# Altium integrated library GPDSE.IntLib: 634 symbols (part 2 of 7)
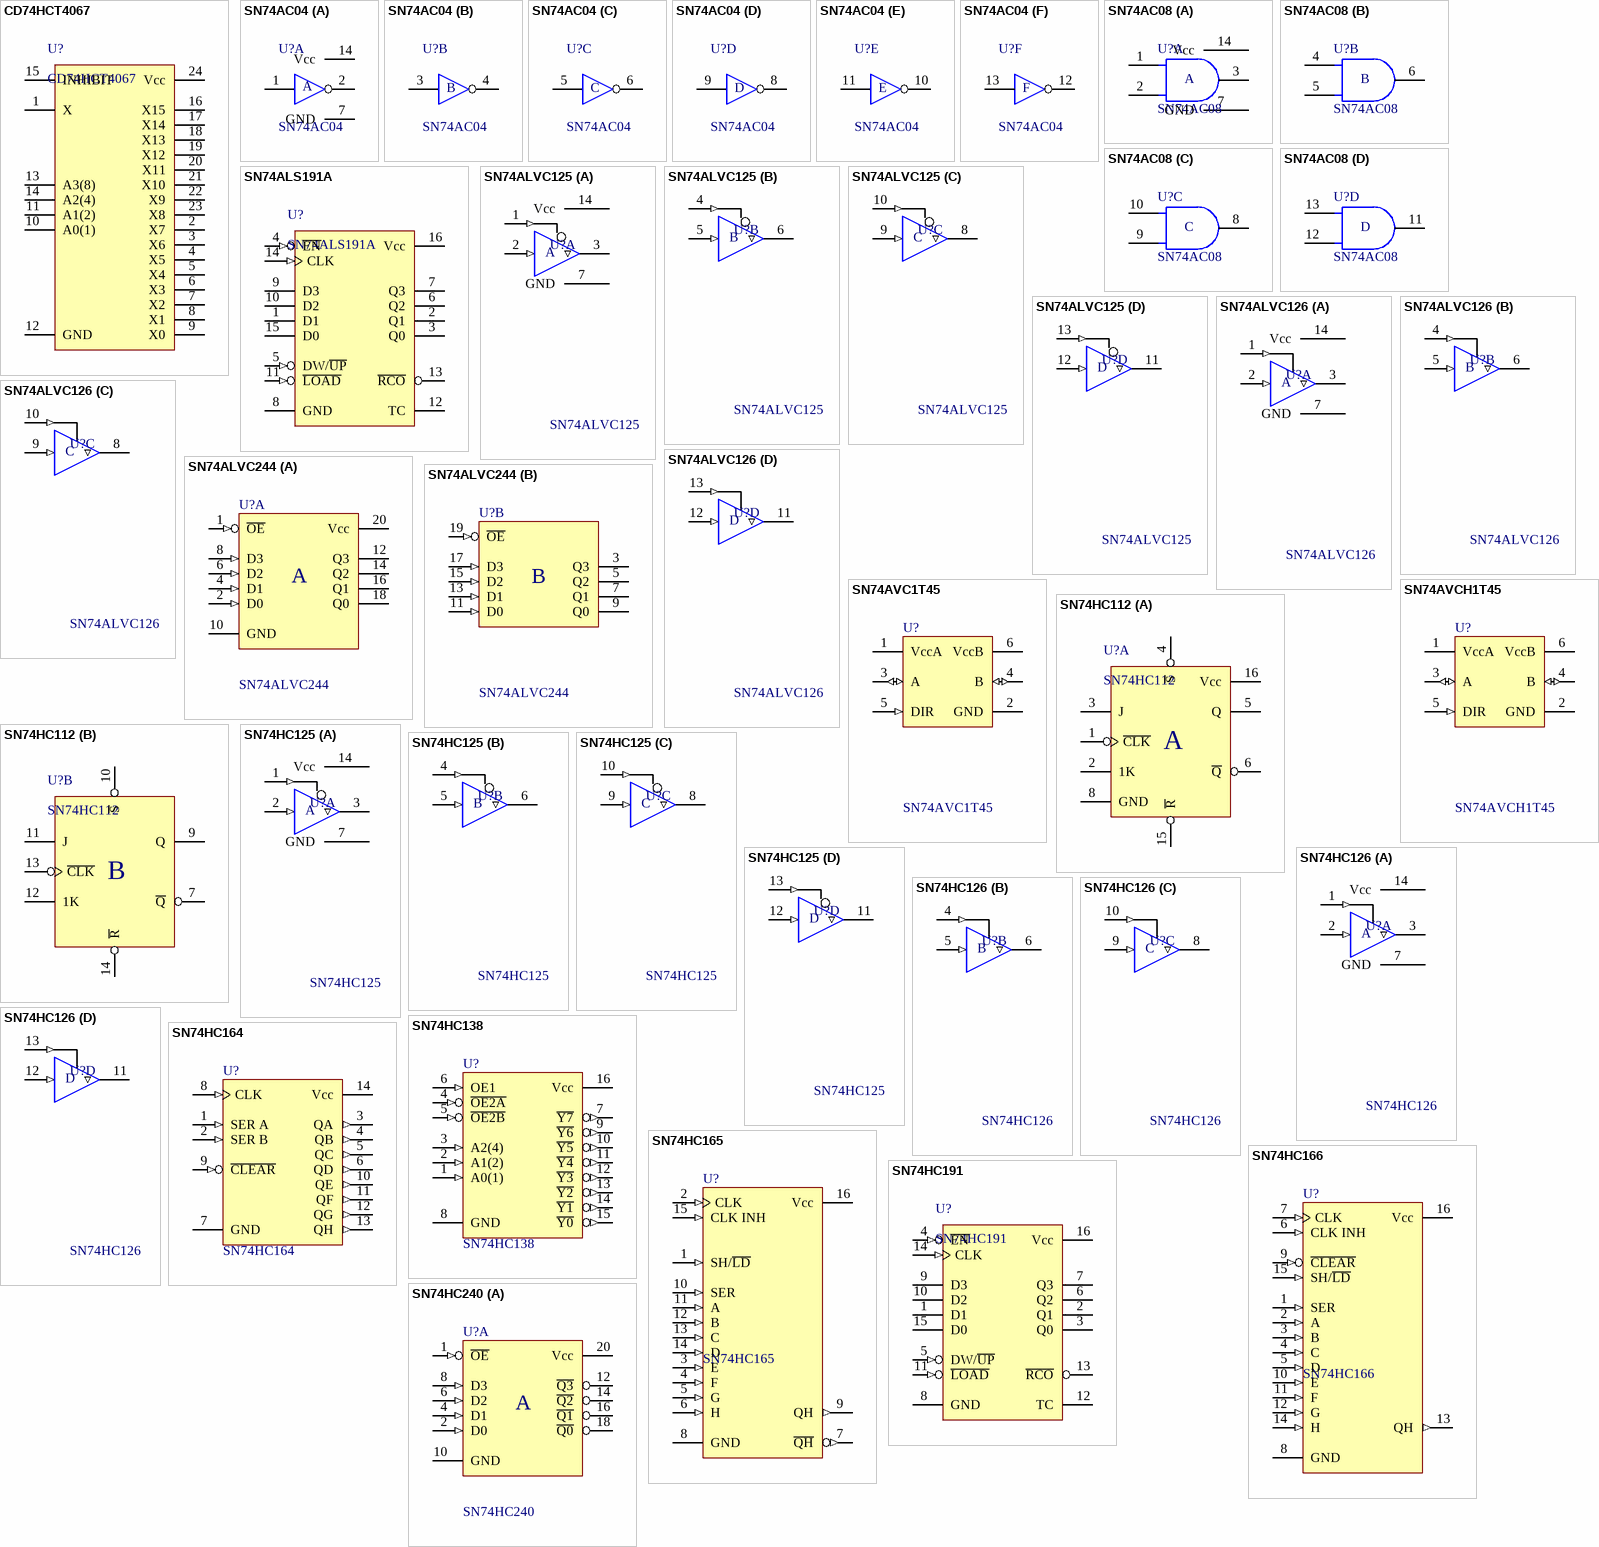
[diagram p36: symbols CD74HCT4067 to SN74HC240]

## SN74HC191
designator U?
[TI] Synchronous Up/Down 4-Bits Counter with Down/Up Mode Control
footprint DIP16-300(100) (DIP; 16 Leads; Row Spacing 7.62 mm; Pitch 2.54 mm; 3D CircuitWorks)
footprint SOIC16-150(50) (SOIC 16 Leads; Row Spacing 3.81 mm; Pitch 1.27 mm; 3D André L´Hérault)
footprint SOP16-5.3mm(1.27mm) (Footprint not found)
pins: 1 D1, 2 Q1, 3 Q0, 4 ~{EN} (in), 5 DW/~{UP} (in), 6 Q2, 7 Q3, 8 GND, 9 D3, 10 D2, 11 ~{LOAD} (in), 12 TC, 13 ~{RCO}, 14 CLK (in), 15 D0, 16 Vcc

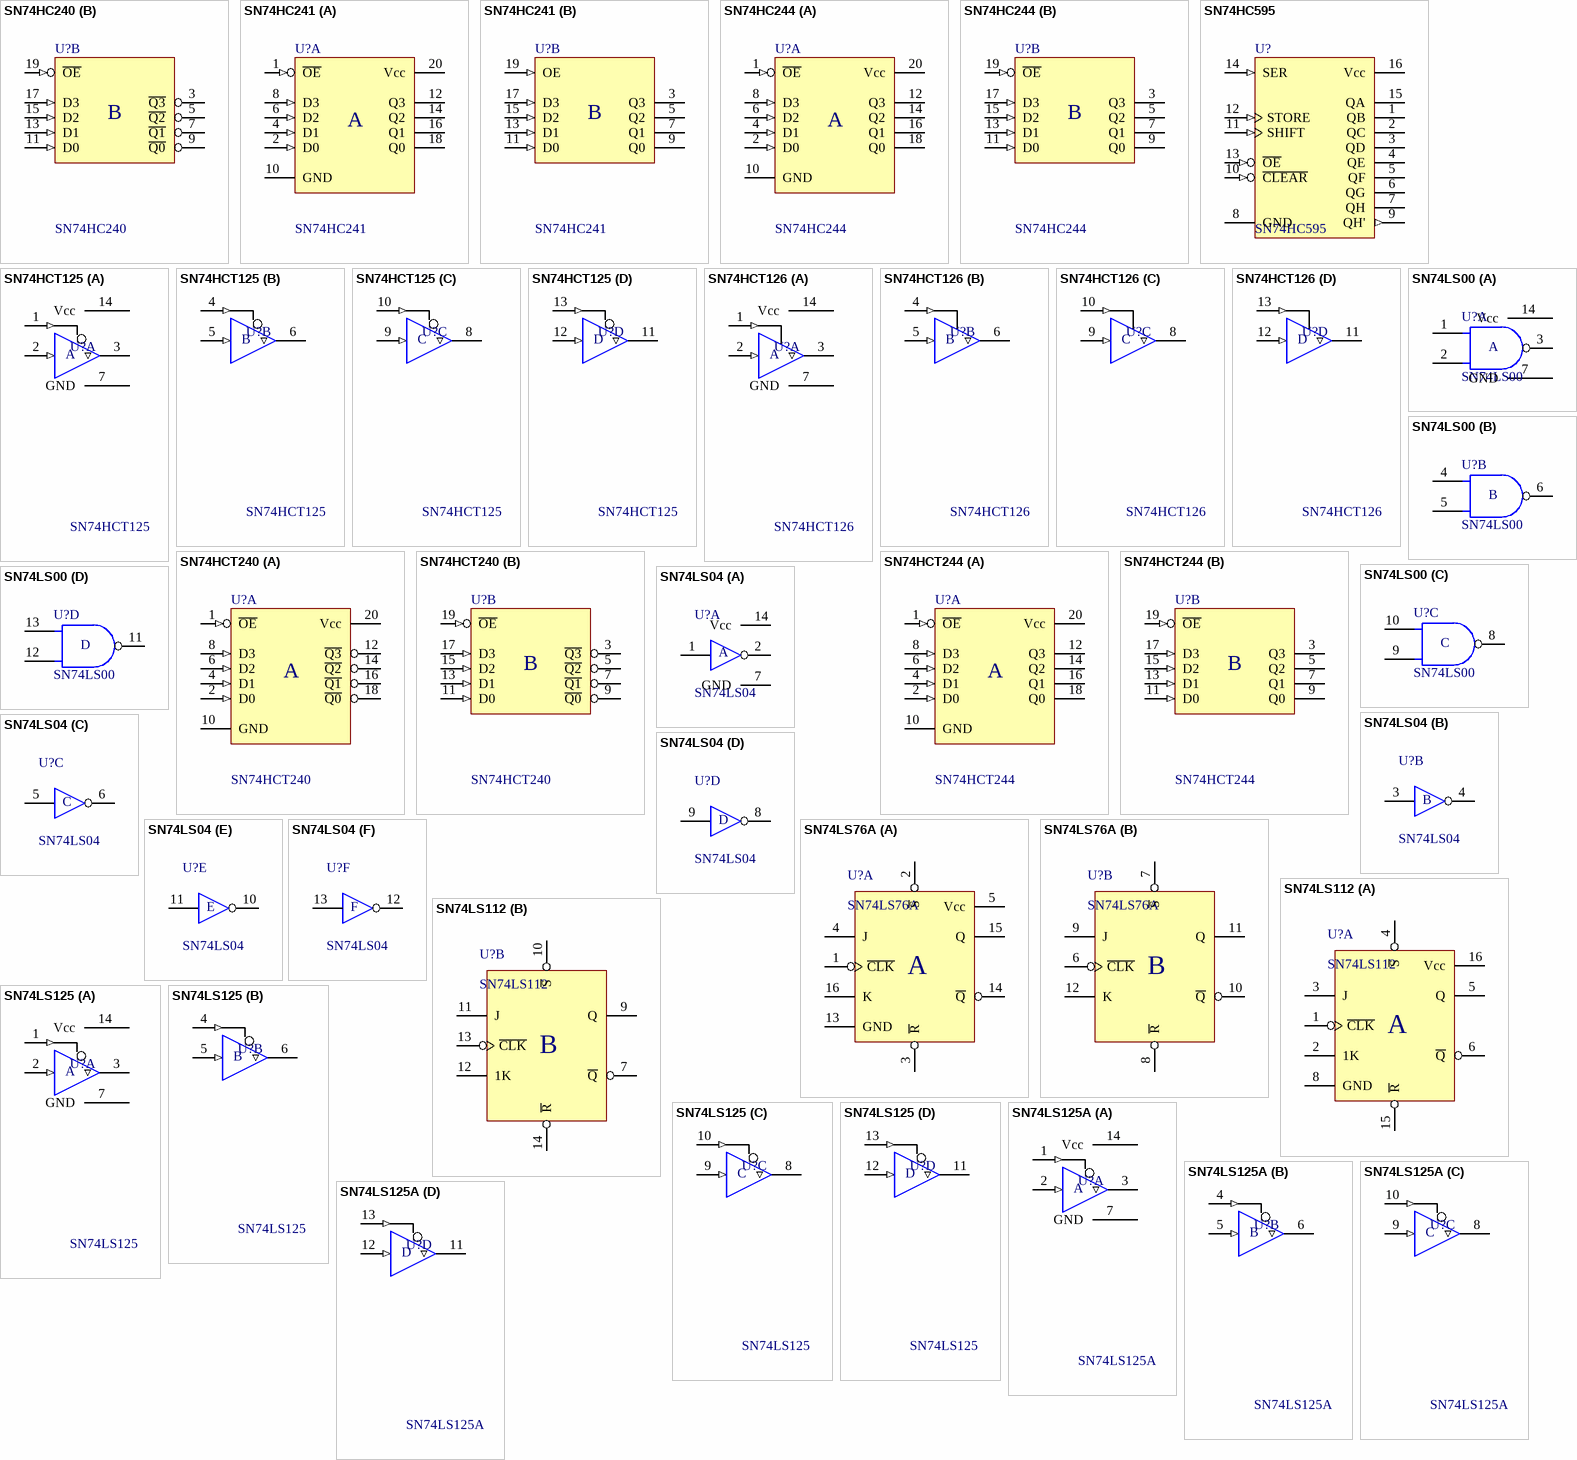
[diagram p4: symbols SN74HC240 to SN74LS125A]

## SN74HC240
designator U?
[TI] Octal Buffer/Driver with 3-State Outputs; Supply Voltage (Vcc): 2.0 to 6.0 V; Input Voltage (Vi): 0 to Vcc; Output High Current (Ioh): -6 mA; Output Low Current (Iol): 6 mA; Propagation Delay (tpd): 9ns; Output Voltage (Vo): 0 to Vcc
footprint SOIC20-300(50) (SOIC 20 Leads; Row Spacing 7.62 mm; Pitch 1.27 mm; 3D André L´Hérault)
footprint SOP20-5.3mm(1.27mm) (Footprint not found)
footprint DIP20-300(100) (Footprint not found)
footprint SOP20-5.3mm(0.65mm) (Small Outline Package 20 pin)
footprint SOP20-4.4mm(0.65mm) (Thin Shrink Small Outline Package 20 pin)
part A pins: 1 ~{OE} (in), 2 D0 (in), 4 D1 (in), 6 D2 (in), 8 D3 (in), 10 GND (power), 12 ~{Q3} (hiz), 14 ~{Q2} (hiz), 16 ~{Q1} (hiz), 18 ~{Q0} (hiz), 20 Vcc (power)
part B pins: 3 ~{Q3} (hiz), 5 ~{Q2} (hiz), 7 ~{Q1} (hiz), 9 ~{Q0} (hiz), 11 D0 (in), 13 D1 (in), 15 D2 (in), 17 D3 (in), 19 ~{OE} (in)
part A text: A
part B text: B

## SN74HC241
designator U?
[TI] Octal Buffer/Driver with 3-State Outputs; Supply Voltage (Vcc): 2.0 to 6.0 V; Input Voltage (Vi): 0 to Vcc; Output High Current (Ioh): -6 mA; Output Low Current (Iol): 6 mA; Propagation Delay (tpd): 11ns; Output Voltage (Vo): 0 to Vcc
footprint SOIC20-300(50) (SOIC 20 Leads; Row Spacing 7.62 mm; Pitch 1.27 mm; 3D André L´Hérault)
footprint SOP20-5.3mm(1.27mm) (Footprint not found)
footprint DIP20-300(100) (Footprint not found)
footprint SOP20-4.4mm(0.65mm) (Thin Shrink Small Outline Package 20 pin)
part A pins: 1 ~{OE} (in), 2 D0 (in), 4 D1 (in), 6 D2 (in), 8 D3 (in), 10 GND (power), 12 Q3 (hiz), 14 Q2 (hiz), 16 Q1 (hiz), 18 Q0 (hiz), 20 Vcc (power)
part B pins: 3 Q3 (hiz), 5 Q2 (hiz), 7 Q1 (hiz), 9 Q0 (hiz), 11 D0 (in), 13 D1 (in), 15 D2 (in), 17 D3 (in), 19 OE (in)
part A text: A
part B text: B

## SN74HC244
designator U?
[TI] Octal Buffer/Driver with 3-State Outputs; Supply Voltage (Vcc): 2.0 to 6.0 V; Input Voltage (Vi): 0 to Vcc; Output High Current (Ioh): -6 mA; Output Low Current (Iol): 6 mA; Propagation Delay (tpd): 11ns; Output Voltage (Vo): 0 to Vcc
footprint SOIC20-300(50) (SOIC 20 Leads; Row Spacing 7.62 mm; Pitch 1.27 mm; 3D André L´Hérault)
footprint SOP20-5.3mm(1.27mm) (Footprint not found)
footprint SOP20-4.4mm(0.65mm) (Footprint not found)
footprint SOP20-5.3mm(0.65mm) (Small Outline Package 20 pin)
footprint DIP20-300(100) (Footprint not found)
part A pins: 1 ~{OE} (in), 2 D0 (in), 4 D1 (in), 6 D2 (in), 8 D3 (in), 10 GND (power), 12 Q3 (hiz), 14 Q2 (hiz), 16 Q1 (hiz), 18 Q0 (hiz), 20 Vcc (power)
part B pins: 3 Q3 (hiz), 5 Q2 (hiz), 7 Q1 (hiz), 9 Q0 (hiz), 11 D0 (in), 13 D1 (in), 15 D2 (in), 17 D3 (in), 19 ~{OE} (in)
part A text: A
part B text: B

## SN74HC595
designator U?
[TI] 8-Bit Shift Register with 3-State Output Registers; Supply Voltage (Vcc): 2.0 to 6.0 V; Input Voltage (Vi): 0 to Vcc; Output High Current (Ioh): -6 mA; Output Low Current (Iol): 6 mA; Clock Frequency (fclock): 36 MHz; Output Voltage (Vo): 0 to Vcc
footprint SOIC16-150(50) (SOIC; 16 Leads; Row Spacing 3.81 mm; Pitch 1.27 mm; 3D Antonio Fagaldo)
footprint DIP16-300(100) (DIP, 16-Leads, Row Spacing 7.62mm, Pitch 2.54mm, Body 22.86x6.35mm)
footprint SOIC16-300(50) (SOIC 16 Leads; Row Spacing 7.62 mm; Pitch 1.27 mm; 3D André L´Hérault)
footprint SOP16-4.4mm(0.65mm) (Thin Shrink Small Outline Package 16 pin)
footprint SOP16-5.3mm(0.65mm) (Small Outline Package 16 pin)
footprint SOP16-5.3mm(1.27mm) (Small Outline Package 16 pin)
pins: 1 QB (hiz), 2 QC (hiz), 3 QD (hiz), 4 QE (hiz), 5 QF (hiz), 6 QG (hiz), 7 QH (hiz), 8 GND (power), 9 QH' (out), 10 ~{CLEAR} (in), 11 SHIFT (in), 12 STORE (in), 13 ~{OE} (in), 14 SER (in), 15 QA (hiz), 16 Vcc (power)

## SN74HCT125
designator U?
[TI] Quadruple Bus Buffer Gates with 3-State Outputs; Supply Voltage (Vcc): 4.5 to 5.5 V; Input Voltage (Vi): 0 to Vcc; Output High Current (Ioh): -6 mA; Output Low Current (Iol): 6 mA; Propagation Delay (tpd): 12ns; Output Voltage (Vo): 0 to Vcc
footprint DIP14-300(100) (DIP, 14-Leads, Row Spacing 7.62mm, Pitch 2.54mm)
footprint SOIC14-150(50) (SOIC 14 Leads; Row Spacing 3.81 mm; Pitch 1.27 mm; 3D André L´Hérault)
part A pins: 1 ~{OE1} (in), 2 A1 (in), 3 Y1 (hiz), 7 GND, 14 Vcc
part B pins: 4 ~{OE2} (in), 5 A2 (in), 6 Y2 (hiz)
part C pins: 8 Y3 (hiz), 9 A3 (in), 10 ~{OE3} (in)
part D pins: 11 Y4 (hiz), 12 A4 (in), 13 ~{OE4} (in)
part A text: A
part B text: B
part C text: C
part D text: D

## SN74HCT126
designator U?
[TI] Quadruple Bus Buffer Gates with 3-State Outputs; Supply Voltage (Vcc): 4.5 to 5.5 V; Input Voltage (Vi): 0 to Vcc; Output High Current (Ioh): -6 mA; Output Low Current (Iol): 6 mA; Propagation Delay (tpd): 12ns; Output Voltage (Vo): 0 to Vcc
footprint DIP14-300(100) (DIP, 14-Leads, Row Spacing 7.62mm, Pitch 2.54mm)
footprint SOIC14-150(50) (SOIC 14 Leads; Row Spacing 3.81 mm; Pitch 1.27 mm; 3D André L´Hérault)
part A pins: 1 OE1 (in), 2 A1 (in), 3 Y1 (hiz), 7 GND, 14 Vcc
part B pins: 4 OE2 (in), 5 A2 (in), 6 Y2 (hiz)
part C pins: 8 Y3 (hiz), 9 A3 (in), 10 OE3 (in)
part D pins: 11 Y4 (hiz), 12 A4 (in), 13 OE4 (in)
part A text: A
part B text: B
part C text: C
part D text: D

## SN74HCT240
designator U?
[TI] Octal Buffer/Driver with 3-State Outputs; Supply Voltage (Vcc): 4.5 to 5.5 V; Input Voltage (Vi): 0 to Vcc; Output High Current (Ioh): -6 mA; Output Low Current (Iol): 6 mA; Propagation Delay (tpd): 12ns; Output Voltage (Vo): 0 to Vcc
footprint SOIC20-300(50) (SOIC 20 Leads; Row Spacing 7.62 mm; Pitch 1.27 mm; 3D André L´Hérault)
footprint SOP20-5.3mm(1.27mm) (Footprint not found)
footprint DIP20-300(100) (Footprint not found)
footprint SOP20-4.4mm(0.65mm) (Thin Shrink Small Outline Package 20 pin)
part A pins: 1 ~{OE} (in), 2 D0 (in), 4 D1 (in), 6 D2 (in), 8 D3 (in), 10 GND (power), 12 ~{Q3} (hiz), 14 ~{Q2} (hiz), 16 ~{Q1} (hiz), 18 ~{Q0} (hiz), 20 Vcc (power)
part B pins: 3 ~{Q3} (hiz), 5 ~{Q2} (hiz), 7 ~{Q1} (hiz), 9 ~{Q0} (hiz), 11 D0 (in), 13 D1 (in), 15 D2 (in), 17 D3 (in), 19 ~{OE} (in)
part A text: A
part B text: B

## SN74HCT244
designator U?
[TI] Octal Buffer/Driver with 3-State Outputs; Supply Voltage (Vcc): 4.5 to 5.5 V; Input Voltage (Vi): 0 to Vcc; Output High Current (Ioh): -6 mA; Output Low Current (Iol): 6 mA; Propagation Delay (tpd): 13ns; Output Voltage (Vo): 0 to Vcc
footprint SOIC20-300(50) (SOIC 20 Leads; Row Spacing 7.62 mm; Pitch 1.27 mm; 3D André L´Hérault)
footprint SOP20-5.3mm(1.27mm) (Footprint not found)
footprint SOP20-4.4mm(0.65mm) (Footprint not found)
footprint SOP20-5.3mm(0.65mm) (Small Outline Package 20 pin)
footprint DIP20-300(100) (Footprint not found)
part A pins: 1 ~{OE} (in), 2 D0 (in), 4 D1 (in), 6 D2 (in), 8 D3 (in), 10 GND (power), 12 Q3 (hiz), 14 Q2 (hiz), 16 Q1 (hiz), 18 Q0 (hiz), 20 Vcc (power)
part B pins: 3 Q3 (hiz), 5 Q2 (hiz), 7 Q1 (hiz), 9 Q0 (hiz), 11 D0 (in), 13 D1 (in), 15 D2 (in), 17 D3 (in), 19 ~{OE} (in)
part A text: A
part B text: B

## SN74LS00
designator U?
[TI] Quad 2-Input NAND Gate; Supply Voltage (Vcc): 4.75 to 5.25 V; Input Voltage (Vi): 0 to Vcc; Output High Current (Ioh): -0.4 mA; Output Low Current (Iol): 8 mA; Propagation Delay High-Low (tphl): 10ns; Propagation Delay Low-High (tplh): 9ns; Output Voltage (Vo): 0 to Vcc
footprint DIP14-300(100) (DIP, 14-Leads, Row Spacing 7.62mm, Pitch 2.54mm)
footprint SOIC14-150(50) (SOIC 14 Leads; Row Spacing 3.81 mm; Pitch 1.27 mm; 3D André L´Hérault)
footprint SOP14-5.3mm(1.27mm) (Small Outline Package 14 pin)
footprint SOP14-5.3mm(0.65mm) (Small Outline Package 14 pin)
part A pins: 1 A0, 2 B0, 3 Y0, 7 GND, 14 Vcc
part B pins: 4 A1, 5 B1, 6 Y1
part C pins: 8 Y2, 9 B2, 10 A2
part D pins: 11 Y3, 12 B3, 13 A3
part A text: A
part B text: B
part C text: C
part D text: D

## SN74LS04
designator U?
[TI] Hex Logic Inverter; Input Voltage (Vi): 0 to Vcc; Output High Current (Ioh): -0.4 mA; Output Low Current (Iol): 8 mA; Propagation Delay High-Low (tphl): 10ns; Propagation Delay Low-High (tplh): 9ns; Supply Voltage (Vcc): 4.75 to 5.25 V; Output Voltage (Vo): 0 to Vcc
footprint DIP14-300(100) (DIP, 14-Leads, Row Spacing 7.62mm, Pitch 2.54mm)
footprint SOIC14-150(50) (Plastic Small Outline 14 pinos)
footprint SOP14-5.3mm(1.27mm) (Small Outline Package 14 pin)
footprint SOP14-5.3mm(0.65mm) (Small Outline Package 14 pin)
part A pins: 1 2A, 2 2Y, 7 GND (power), 14 Vcc (power)
part B pins: 3 2A, 4 2Y
part C pins: 5 3A, 6 3Y
part D pins: 8 4Y, 9 4A
part E pins: 10 5Y, 11 5A
part F pins: 12 6Y, 13 6A
part A text: A
part B text: B
part C text: C
part D text: D
part E text: E
part F text: F

## SN74LS76A
designator U?
Dual JK Flip-Flop with Preset and Clear
footprint DIP16-300(100) (DIP, 16-Leads, Row Spacing 7.62mm, Pitch 2.54mm, Body 22.86x6.35mm)
footprint SOIC16-150(50) (Small Outline Integrated Circuit Package; 16 leads; Row Spacing 150 mils; Pitch 50 mils)
part A pins: 1 ~{CLK}, 2 ~{S}, 3 ~{R}, 4 J, 5 Vcc (power), 13 GND (power), 14 ~{Q}, 15 Q, 16 K
part B pins: 6 ~{CLK}, 7 ~{S}, 8 ~{R}, 9 J, 10 ~{Q}, 11 Q, 12 K
part A text: A
part B text: B

## SN74LS112
designator U?
[TI] Dual JK Negative Edge Triggered Flip-Flop with Set and Reset; Input Voltage (Vi): 0 to Vcc; Output High Current (Ioh): +8 mA; Output Low Current (Iol): -0.4 mA; Propagation Delay High-Low (tphl): 20ns; Supply Voltage (Vcc): 4.75 to 5.25 V; Output Voltage (Vo): 0 to Vcc; Propagation Delay Low-High (tplh): 20ns
footprint SOIC16-150(50) (SOIC 16 Leads; Row Spacing 3.81 mm; Pitch 1.27 mm; 3D André L´Hérault)
footprint DIP16-300(100) (DIP, 16-Leads, Row Spacing 7.62mm, Pitch 2.54mm, Body 22.86x6.35mm)
footprint SOP16-5.3mm(1.27mm) (Small Outline Package 16 pin)
part A pins: 1 ~{CLK}, 2 1K, 3 J, 4 ~{S}, 5 Q, 6 ~{Q}, 8 GND (power), 15 ~{R}, 16 Vcc (power)
part B pins: 7 ~{Q}, 9 Q, 10 ~{S}, 11 J, 12 1K, 13 ~{CLK}, 14 ~{R}
part A text: A
part B text: B

## SN74LS125
designator U?
[TI] Quadruple Bus Buffer Gates with 3-State Outputs; Supply Voltage (Vcc): 4.75 to 5.25 V; Input Voltage (Vi): 0 to Vcc; Output High Current (Ioh): -5.2 mA; Output Low Current (Iol): 16 mA; Propagation Delay (tpd): 12ns; Output Voltage (Vo): 0 to Vcc
footprint DIP14-300(100) (DIP, 14-Leads, Row Spacing 7.62mm, Pitch 2.54mm)
part A pins: 1 ~{OE1} (in), 2 A1 (in), 3 Y1 (hiz), 7 GND, 14 Vcc
part B pins: 4 ~{OE2} (in), 5 A2 (in), 6 Y2 (hiz)
part C pins: 8 Y3 (hiz), 9 A3 (in), 10 ~{OE3} (in)
part D pins: 11 Y4 (hiz), 12 A4 (in), 13 ~{OE4} (in)
part A text: A
part B text: B
part C text: C
part D text: D

## SN74LS125A
designator U?
[TI] Quadruple Bus Buffer Gates with 3-State Outputs; Supply Voltage (Vcc): 4.75 to 5.25 V; Input Voltage (Vi): 0 to Vcc; Output High Current (Ioh): -5.2 mA; Output Low Current (Iol): 16 mA; Propagation Delay (tpd): 12ns; Output Voltage (Vo): 0 to Vcc
footprint DIP14-300(100) (DIP, 14-Leads, Row Spacing 7.62mm, Pitch 2.54mm)
footprint SOIC14-150(50) (SOIC 14 Leads; Row Spacing 3.81 mm; Pitch 1.27 mm; 3D André L´Hérault)
footprint SOP14-5.3mm(1.27mm) (Small Outline Package 14 pin)
footprint SOP14-5.3mm(0.65mm) (Small Outline Package 14 pin)
part A pins: 1 ~{OE1} (in), 2 A1 (in), 3 Y1 (hiz), 7 GND, 14 Vcc
part B pins: 4 ~{OE2} (in), 5 A2 (in), 6 Y2 (hiz)
part C pins: 8 Y3 (hiz), 9 A3 (in), 10 ~{OE3} (in)
part D pins: 11 Y4 (hiz), 12 A4 (in), 13 ~{OE4} (in)
part A text: A
part B text: B
part C text: C
part D text: D

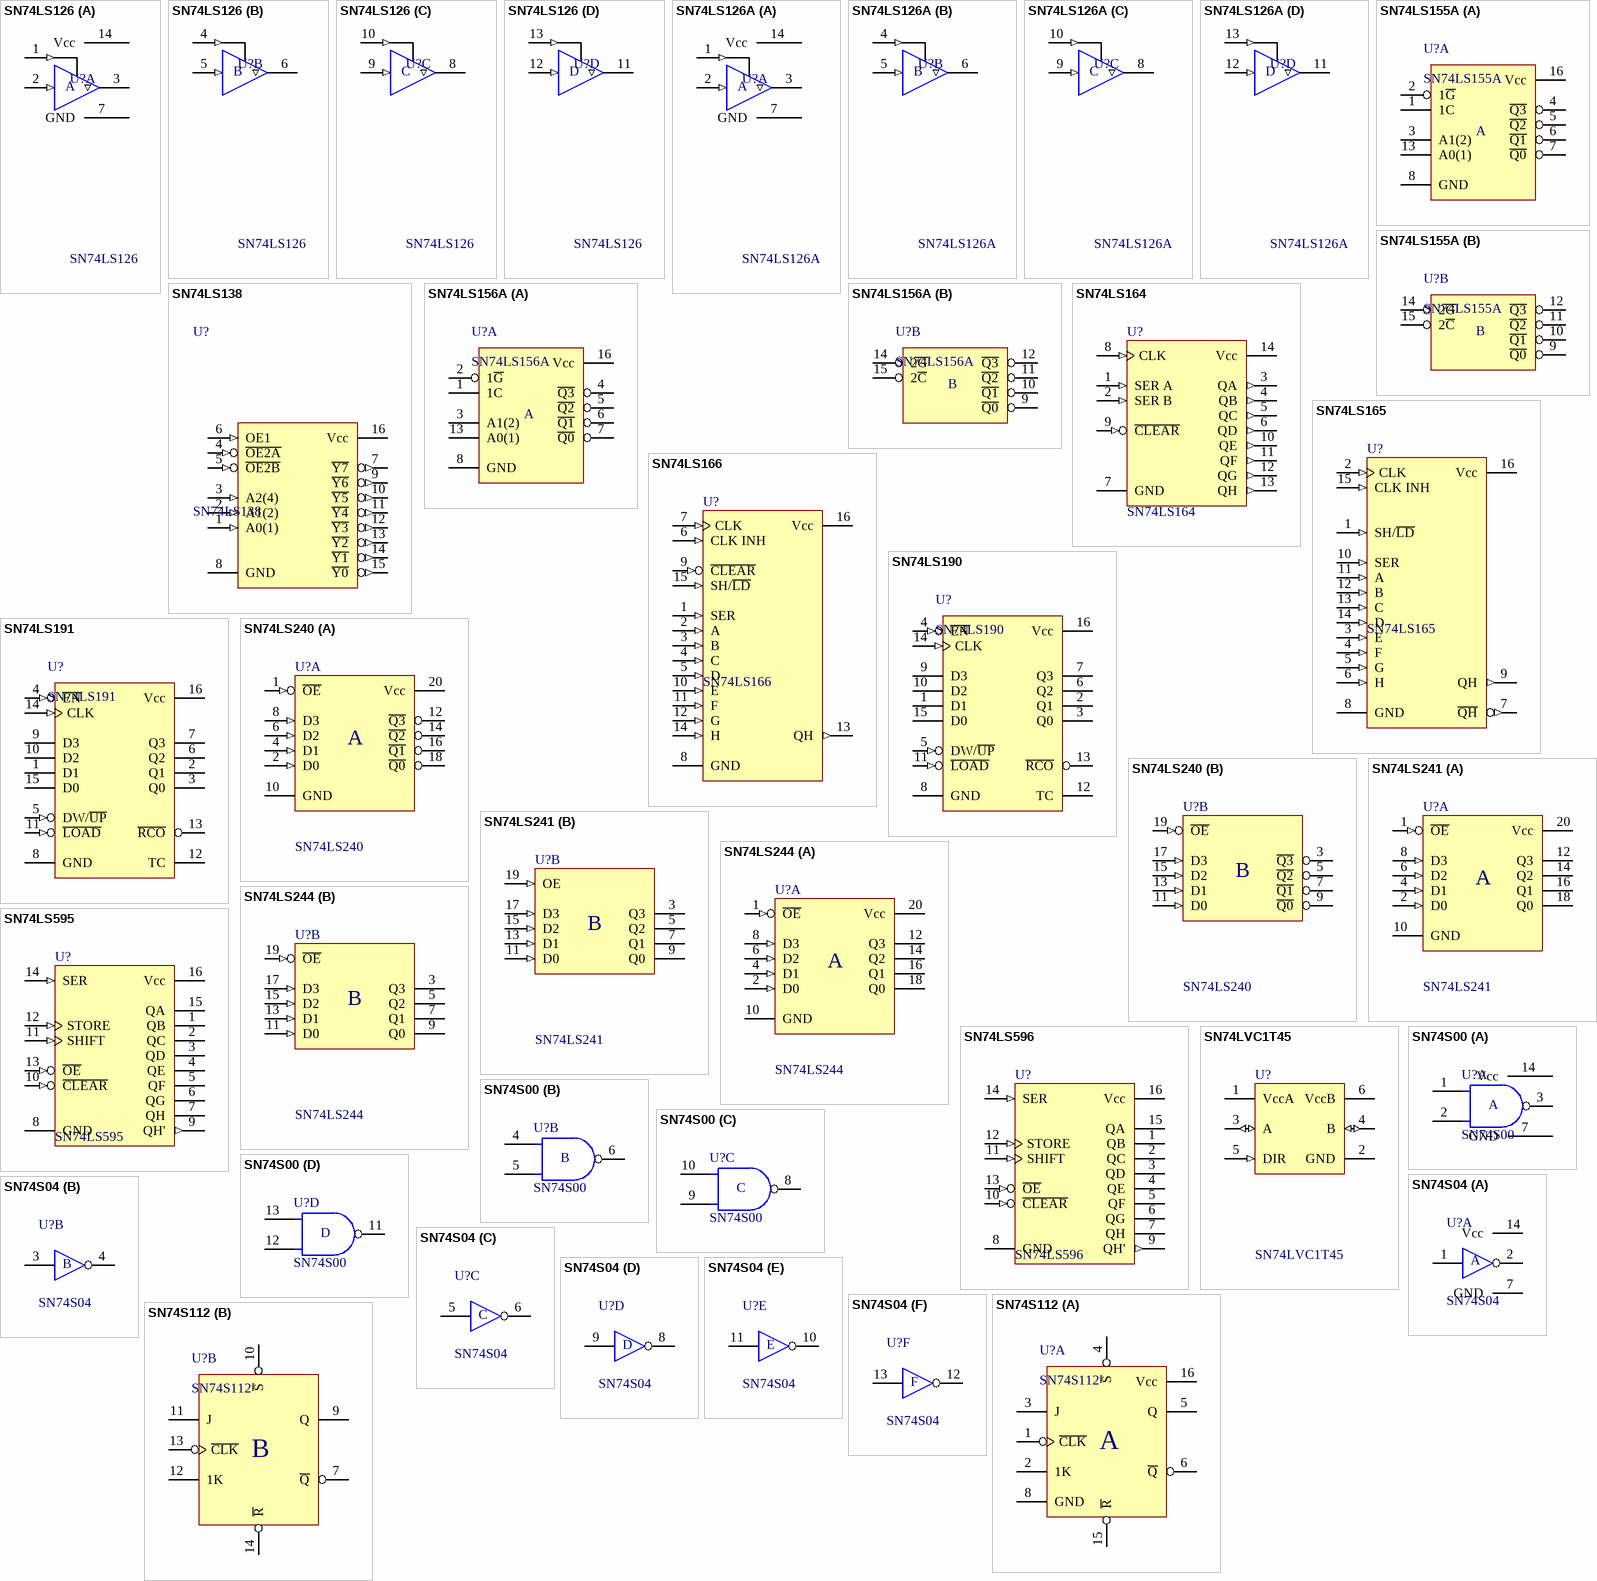
[diagram p5: symbols SN74LS126 to SN74S112]

## SN74LS126
designator U?
[TI] Quadruple Bus Buffer Gates with 3-State Outputs; Supply Voltage (Vcc): 4.75 to 5.25 V; Input Voltage (Vi): 0 to Vcc; Output High Current (Ioh): -5.2 mA; Output Low Current (Iol): 16 mA; Propagation Delay (tpd): 12ns; Output Voltage (Vo): 0 to Vcc
footprint DIP14-300(100) (DIP, 14-Leads, Row Spacing 7.62mm, Pitch 2.54mm)
part A pins: 1 OE1 (in), 2 A1 (in), 3 Y1 (hiz), 7 GND, 14 Vcc
part B pins: 4 OE2 (in), 5 A2 (in), 6 Y2 (hiz)
part C pins: 8 Y3 (hiz), 9 A3 (in), 10 OE3 (in)
part D pins: 11 Y4 (hiz), 12 A4 (in), 13 OE4 (in)
part A text: A
part B text: B
part C text: C
part D text: D

## SN74LS126A
designator U?
[TI] Quadruple Bus Buffer Gates with 3-State Outputs; Supply Voltage (Vcc): 4.75 to 5.25 V; Input Voltage (Vi): 0 to Vcc; Output High Current (Ioh): -5.2 mA; Output Low Current (Iol): 16 mA; Propagation Delay (tpd): 12ns; Output Voltage (Vo): 0 to Vcc
footprint DIP14-300(100) (DIP, 14-Leads, Row Spacing 7.62mm, Pitch 2.54mm)
footprint SOIC14-150(50) (SOIC 14 Leads; Row Spacing 3.81 mm; Pitch 1.27 mm; 3D André L´Hérault)
footprint SOP14-5.3mm(1.27mm) (Small Outline Package 14 pin)
part A pins: 1 OE1 (in), 2 A1 (in), 3 Y1 (hiz), 7 GND, 14 Vcc
part B pins: 4 OE2 (in), 5 A2 (in), 6 Y2 (hiz)
part C pins: 8 Y3 (hiz), 9 A3 (in), 10 OE3 (in)
part D pins: 11 Y4 (hiz), 12 A4 (in), 13 OE4 (in)
part A text: A
part B text: B
part C text: C
part D text: D

## SN74LS138
designator U?
[TI] 3-Line to 8-Line Decoder / Demultiplexer; Output Voltage (Vo): 0 to Vcc; Supply Voltage (Vcc): 4.75 to 5.25 V; Propagation Delay High-Low (tphl): 20ns; Propagation Delay Low-High (tplh): 21ns; Output High Current (Ioh): -0.4 mA; Output Low Current (Iol): 8 mA; Input Voltage (Vi): 0 to Vcc
footprint DIP16-300(100) (Footprint not found)
footprint SOIC16-150(50) (Plastic Small Outline 16 pinos)
pins: 1 A0(1) (in), 2 A1(2) (in), 3 A2(4) (in), 4 ~{OE2A} (in), 5 ~{OE2B} (in), 6 OE1 (in), 7 ~{Y7} (out), 8 GND (power), 9 ~{Y6} (out), 10 ~{Y5} (out), 11 ~{Y4} (out), 12 ~{Y3} (out), 13 ~{Y2} (out), 14 ~{Y1} (out), 15 ~{Y0} (out), 16 Vcc (power)

## SN74LS155A
designator U?
[TI] Dual 2-Line to 4-Line Decoder / Demultiplexer
footprint DIP16-300(100) (Footprint not found)
footprint SOIC16-150(50) (Plastic Small Outline 16 pinos)
footprint SOP16-5.3mm(1.27mm) (Footprint not found)
part A pins: 1 1C, 2 1~{G}, 3 A1(2), 4 ~{Q3}, 5 ~{Q2}, 6 ~{Q1}, 7 ~{Q0}, 8 GND, 13 A0(1), 16 Vcc
part B pins: 9 ~{Q0}, 10 ~{Q1}, 11 ~{Q2}, 12 ~{Q3}, 14 2~{G}, 15 2~{C}
part A text: A
part B text: B

## SN74LS156A
designator U?
[TI] Dual 2-Line to 4-Line Decoder / Demultiplexer
footprint DIP16-300(100) (Footprint not found)
footprint SOIC16-150(50) (Plastic Small Outline 16 pinos)
footprint SOP16-5.3mm(1.27mm) (Footprint not found)
part A pins: 1 1C, 2 1~{G}, 3 A1(2), 4 ~{Q3}, 5 ~{Q2}, 6 ~{Q1}, 7 ~{Q0}, 8 GND, 13 A0(1), 16 Vcc
part B pins: 9 ~{Q0}, 10 ~{Q1}, 11 ~{Q2}, 12 ~{Q3}, 14 2~{G}, 15 2~{C}
part A text: A
part B text: B

## SN74LS164
designator U?
[TI] 8-bit Parallel-Out Serial Shift Registers; Supply Voltage (Vcc): 4.75 to 5.25 V; Input Voltage (Vi): 0 to Vcc; Output High Current (Ioh): -0.8 mA; Output Low Current (Iol): 8 mA; Clock Frequency (fclock): 25 MHz; Output Voltage (Vo): 0 to Vcc
footprint DIP14-300(100) (DIP, 14-Leads, Row Spacing 7.62mm, Pitch 2.54mm)
footprint SOIC14-150(50) (SOIC 14 Leads; Row Spacing 3.81 mm; Pitch 1.27 mm; 3D André L´Hérault)
footprint SOP14-5.3mm(1.27mm) (Small Outline Package 14 pin)
pins: 1 SER A (in), 2 SER B (in), 3 QA (out), 4 QB (out), 5 QC (out), 6 QD (out), 7 GND (power), 8 CLK (in), 9 ~{CLEAR} (in), 10 QE (out), 11 QF (out), 12 QG (out), 13 QH (out), 14 Vcc (power)

## SN74LS165
designator U?
[TI] Parallel-Load 8-bit Shift Registers; Supply Voltage (Vcc): 4.75 to 5.25 V; Input Voltage (Vi): 0 to Vcc; Output High Current (Ioh): -0.8 mA; Output Low Current (Iol): 8 mA; Clock Frequency (fclock): 25 MHz; Output Voltage (Vo): 0 to Vcc
footprint DIP16-300(100) (DIP, 16-Leads, Row Spacing 7.62mm, Pitch 2.54mm, Body 22.86x6.35mm)
footprint SOIC16-150(50) (SOIC 16 Leads; Row Spacing 3.81 mm; Pitch 1.27 mm; 3D André L´Hérault)
footprint SOP16-5.3mm(1.27mm) (Small Outline Package 16 pin)
pins: 1 SH/~{LD} (in), 2 CLK (in), 3 E (in), 4 F (in), 5 G (in), 6 H (in), 7 ~{QH} (out), 8 GND (power), 9 QH (out), 10 SER (in), 11 A (in), 12 B (in), 13 C (in), 14 D (in), 15 CLK INH (in), 16 Vcc (power)

## SN74LS166
designator U?
[TI] Parallel-Load 8-bit Shift Registers; Supply Voltage (Vcc): 4.75 to 5.25 V; Input Voltage (Vi): 0 to Vcc; Output High Current (Ioh): -0.8 mA; Output Low Current (Iol): 8 mA; Clock Frequency (fclock): 25 MHz; Output Voltage (Vo): 0 to Vcc
footprint DIP16-300(100) (DIP, 16-Leads, Row Spacing 7.62mm, Pitch 2.54mm, Body 22.86x6.35mm)
footprint SOIC16-150(50) (SOIC 16 Leads; Row Spacing 3.81 mm; Pitch 1.27 mm; 3D André L´Hérault)
footprint SOP16-5.3mm(1.27mm) (Small Outline Package 16 pin)
pins: 1 SER (in), 2 A (in), 3 B (in), 4 C (in), 5 D (in), 6 CLK INH (in), 7 CLK (in), 8 GND (power), 9 ~{CLEAR} (in), 10 E (in), 11 F (in), 12 G (in), 13 QH (out), 14 H (in), 15 SH/~{LD} (in), 16 Vcc (power)

## SN74LS190
designator U?
[TI] Synchronous Up/Down BCD Decade Counter with Down/Up Mode Control
footprint DIP16-300(100) (DIP; 16 Leads; Row Spacing 7.62 mm; Pitch 2.54 mm; 3D CircuitWorks)
footprint SOIC16-150(50) (SOIC 16 Leads; Row Spacing 3.81 mm; Pitch 1.27 mm; 3D André L´Hérault)
pins: 1 D1, 2 Q1, 3 Q0, 4 ~{EN} (in), 5 DW/~{UP} (in), 6 Q2, 7 Q3, 8 GND, 9 D3, 10 D2, 11 ~{LOAD} (in), 12 TC, 13 ~{RCO}, 14 CLK (in), 15 D0, 16 Vcc

## SN74LS191
designator U?
[TI] Synchronous Up/Down 4-Bits Counter with Down/Up Mode Control
footprint DIP16-300(100) (DIP; 16 Leads; Row Spacing 7.62 mm; Pitch 2.54 mm; 3D CircuitWorks)
footprint SOIC16-150(50) (SOIC 16 Leads; Row Spacing 3.81 mm; Pitch 1.27 mm; 3D André L´Hérault)
pins: 1 D1, 2 Q1, 3 Q0, 4 ~{EN} (in), 5 DW/~{UP} (in), 6 Q2, 7 Q3, 8 GND, 9 D3, 10 D2, 11 ~{LOAD} (in), 12 TC, 13 ~{RCO}, 14 CLK (in), 15 D0, 16 Vcc

## SN74LS240
designator U?
[TI] Octal Buffer/Driver with 3-State Outputs; Supply Voltage (Vcc): 4.75 to 5.25 V; Input Voltage (Vi): 0 to Vcc; Output High Current (Ioh): -15 mA; Output Low Current (Iol): 24 mA; Propagation Delay (tpd): 12ns; Output Voltage (Vo): 0 to Vcc
footprint SOIC20-300(50) (SOIC 20 Leads; Row Spacing 7.62 mm; Pitch 1.27 mm; 3D André L´Hérault)
footprint SOP20-5.3mm(1.27mm) (Footprint not found)
footprint DIP20-300(100) (Footprint not found)
footprint SOP20-5.3mm(0.65mm) (Small Outline Package 20 pin)
part A pins: 1 ~{OE} (in), 2 D0 (in), 4 D1 (in), 6 D2 (in), 8 D3 (in), 10 GND (power), 12 ~{Q3} (hiz), 14 ~{Q2} (hiz), 16 ~{Q1} (hiz), 18 ~{Q0} (hiz), 20 Vcc (power)
part B pins: 3 ~{Q3} (hiz), 5 ~{Q2} (hiz), 7 ~{Q1} (hiz), 9 ~{Q0} (hiz), 11 D0 (in), 13 D1 (in), 15 D2 (in), 17 D3 (in), 19 ~{OE} (in)
part A text: A
part B text: B

## SN74LS241
designator U?
[TI] Octal Buffer/Driver with 3-State Outputs; Supply Voltage (Vcc): 4.75 to 5.25 V; Input Voltage (Vi): 0 to Vcc; Output High Current (Ioh): -15 mA; Output Low Current (Iol): 24 mA; Propagation Delay (tpd): 12ns; Output Voltage (Vo): 0 to Vcc
footprint SOIC20-300(50) (SOIC 20 Leads; Row Spacing 7.62 mm; Pitch 1.27 mm; 3D André L´Hérault)
footprint SOP20-5.3mm(1.27mm) (Footprint not found)
footprint DIP20-300(100) (Footprint not found)
part A pins: 1 ~{OE} (in), 2 D0 (in), 4 D1 (in), 6 D2 (in), 8 D3 (in), 10 GND (power), 12 Q3 (hiz), 14 Q2 (hiz), 16 Q1 (hiz), 18 Q0 (hiz), 20 Vcc (power)
part B pins: 3 Q3 (hiz), 5 Q2 (hiz), 7 Q1 (hiz), 9 Q0 (hiz), 11 D0 (in), 13 D1 (in), 15 D2 (in), 17 D3 (in), 19 OE (in)
part A text: A
part B text: B

## SN74LS244
designator U?
[TI] Octal Buffer/Driver with 3-State Outputs; Supply Voltage (Vcc): 4.75 to 5.25 V; Input Voltage (Vi): 0 to Vcc; Output High Current (Ioh): -15 mA; Output Low Current (Iol): 24 mA; Propagation Delay (tpd): 12ns; Output Voltage (Vo): 0 to Vcc
footprint SOIC20-300(50) (SOIC 20 Leads; Row Spacing 7.62 mm; Pitch 1.27 mm; 3D André L´Hérault)
footprint SOP20-5.3mm(1.27mm) (Footprint not found)
footprint SOP20-5.3mm(0.65mm) (Small Outline Package 20 pin)
footprint DIP20-300(100) (Footprint not found)
part A pins: 1 ~{OE} (in), 2 D0 (in), 4 D1 (in), 6 D2 (in), 8 D3 (in), 10 GND (power), 12 Q3 (hiz), 14 Q2 (hiz), 16 Q1 (hiz), 18 Q0 (hiz), 20 Vcc (power)
part B pins: 3 Q3 (hiz), 5 Q2 (hiz), 7 Q1 (hiz), 9 Q0 (hiz), 11 D0 (in), 13 D1 (in), 15 D2 (in), 17 D3 (in), 19 ~{OE} (in)
part A text: A
part B text: B

## SN74LS595
designator U?
[TI] 8-Bit Shift Register with 3-State Output Registers; Supply Voltage (Vcc): 4.75 to 5.25 V; Input Voltage (Vi): 0 to Vcc; Output High Current (Ioh): -2.6 mA; Output Low Current (Iol): 24 mA; Clock Frequency (fclock): 20 MHz; Output Voltage (Vo): 0 to Vcc
footprint SOIC16-150(50) (SOIC; 16 Leads; Row Spacing 3.81 mm; Pitch 1.27 mm; 3D Antonio Fagaldo)
footprint DIP16-300(100) (DIP, 16-Leads, Row Spacing 7.62mm, Pitch 2.54mm, Body 22.86x6.35mm)
pins: 1 QB (hiz), 2 QC (hiz), 3 QD (hiz), 4 QE (hiz), 5 QF (hiz), 6 QG (hiz), 7 QH (hiz), 8 GND (power), 9 QH' (out), 10 ~{CLEAR} (in), 11 SHIFT (in), 12 STORE (in), 13 ~{OE} (in), 14 SER (in), 15 QA (hiz), 16 Vcc (power)

## SN74LS596
designator U?
[TI] 8-Bit Shift Register with Open Collector Output Registers; Supply Voltage (Vcc): 4.75 to 5.25 V; Input Voltage (Vi): 0 to Vcc; Output Low Current (Iol): 24 mA; Clock Frequency (fclock): 20 MHz; Output Voltage (Vo): 0 to Vcc; Output High Current (Ioh): N/A
footprint SOIC16-150(50) (SOIC; 16 Leads; Row Spacing 3.81 mm; Pitch 1.27 mm; 3D Antonio Fagaldo)
footprint DIP16-300(100) (DIP, 16-Leads, Row Spacing 7.62mm, Pitch 2.54mm, Body 22.86x6.35mm)
pins: 1 QB (hiz), 2 QC (hiz), 3 QD (hiz), 4 QE (hiz), 5 QF (hiz), 6 QG (hiz), 7 QH (hiz), 8 GND (power), 9 QH' (out), 10 ~{CLEAR} (in), 11 SHIFT (in), 12 STORE (in), 13 ~{OE} (in), 14 SER (in), 15 QA (hiz), 16 Vcc (power)

## SN74LVC1T45
designator U?
[TI] Single-Bit Dual-Supply Bus Transceiver with Configurable Voltage Translation and 3-State Outputs; Supply Voltage (Vcc): 1.65 to 5.5 V; Input Voltage (Vi): 0 to 6.5 V; Output Voltage (Vo): 0 to Vcc; Output High Current (Ioh): -24 mA; Output Low Current (Iol): 24 mA; Max Data Rate: 420 Mbps
footprint SOT-23/6 (Small Outline Transistor 6 leads)
pins: 1 VccA (power), 2 GND (power), 3 A (io), 4 B (io), 5 DIR (in), 6 VccB (power)

## SN74S00
designator U?
[TI] Quad 2-Input NAND Gate; Supply Voltage (Vcc): 4.75 to 5.25 V; Input Voltage (Vi): 0 to Vcc; Output High Current (Ioh): -1 mA; Output Low Current (Iol): 20 mA; Propagation Delay High-Low (tphl): 5ns; Propagation Delay Low-High (tplh): 4.5ns; Output Voltage (Vo): 0 to Vcc
footprint DIP14-300(100) (DIP, 14-Leads, Row Spacing 7.62mm, Pitch 2.54mm)
footprint SOIC14-150(50) (SOIC 14 Leads; Row Spacing 3.81 mm; Pitch 1.27 mm; 3D André L´Hérault)
footprint SOP14-5.3mm(1.27mm) (Small Outline Package 14 pin)
part A pins: 1 A0, 2 B0, 3 Y0, 7 GND, 14 Vcc
part B pins: 4 A1, 5 B1, 6 Y1
part C pins: 8 Y2, 9 B2, 10 A2
part D pins: 11 Y3, 12 B3, 13 A3
part A text: A
part B text: B
part C text: C
part D text: D

## SN74S04
designator U?
[TI] Hex Logic Inverter; Input Voltage (Vi): 0 to Vcc; Output High Current (Ioh): -1 mA; Output Low Current (Iol): 20 mA; Propagation Delay High-Low (tphl): 5ns; Propagation Delay Low-High (tplh): 4.5ns; Supply Voltage (Vcc): 4.75 to 5.25 V; Output Voltage (Vo): 0 to Vcc
footprint DIP14-300(100) (DIP, 14-Leads, Row Spacing 7.62mm, Pitch 2.54mm)
footprint SOIC14-150(50) (Plastic Small Outline 14 pinos)
footprint SOP14-5.3mm(1.27mm) (Small Outline Package 14 pin)
part A pins: 1 2A, 2 2Y, 7 GND (power), 14 Vcc (power)
part B pins: 3 2A, 4 2Y
part C pins: 5 3A, 6 3Y
part D pins: 8 4Y, 9 4A
part E pins: 10 5Y, 11 5A
part F pins: 12 6Y, 13 6A
part A text: A
part B text: B
part C text: C
part D text: D
part E text: E
part F text: F

## SN74S112
designator U?
[TI] Dual JK Negative Edge Triggered Flip-Flop with Set and Reset; Input Voltage (Vi): 0 to Vcc; Output High Current (Ioh): +20 mA; Output Low Current (Iol): -1 mA; Propagation Delay High-Low (tphl): 7ns; Supply Voltage (Vcc): 4.75 to 5.25 V; Output Voltage (Vo): 0 to Vcc; Propagation Delay Low-High (tplh): 7ns
footprint SOIC16-150(50) (SOIC 16 Leads; Row Spacing 3.81 mm; Pitch 1.27 mm; 3D André L´Hérault)
footprint DIP16-300(100) (DIP, 16-Leads, Row Spacing 7.62mm, Pitch 2.54mm, Body 22.86x6.35mm)
part A pins: 1 ~{CLK}, 2 1K, 3 J, 4 ~{S}, 5 Q, 6 ~{Q}, 8 GND (power), 15 ~{R}, 16 Vcc (power)
part B pins: 7 ~{Q}, 9 Q, 10 ~{S}, 11 J, 12 1K, 13 ~{CLK}, 14 ~{R}
